# Altium footprint library SDRdrum.PcbLib: 35 footprints (part 1 of 3)
Each footprint in its own frame and in the unit in brackets; x right, y up, seen from the top. Pads: shape width x height; smd on the part's side, far side on the other; paste and mask are expansions set on the pad; w line width, h text height; cw(c..) or ccw(c..) is an arc to the next point about the centre after c.
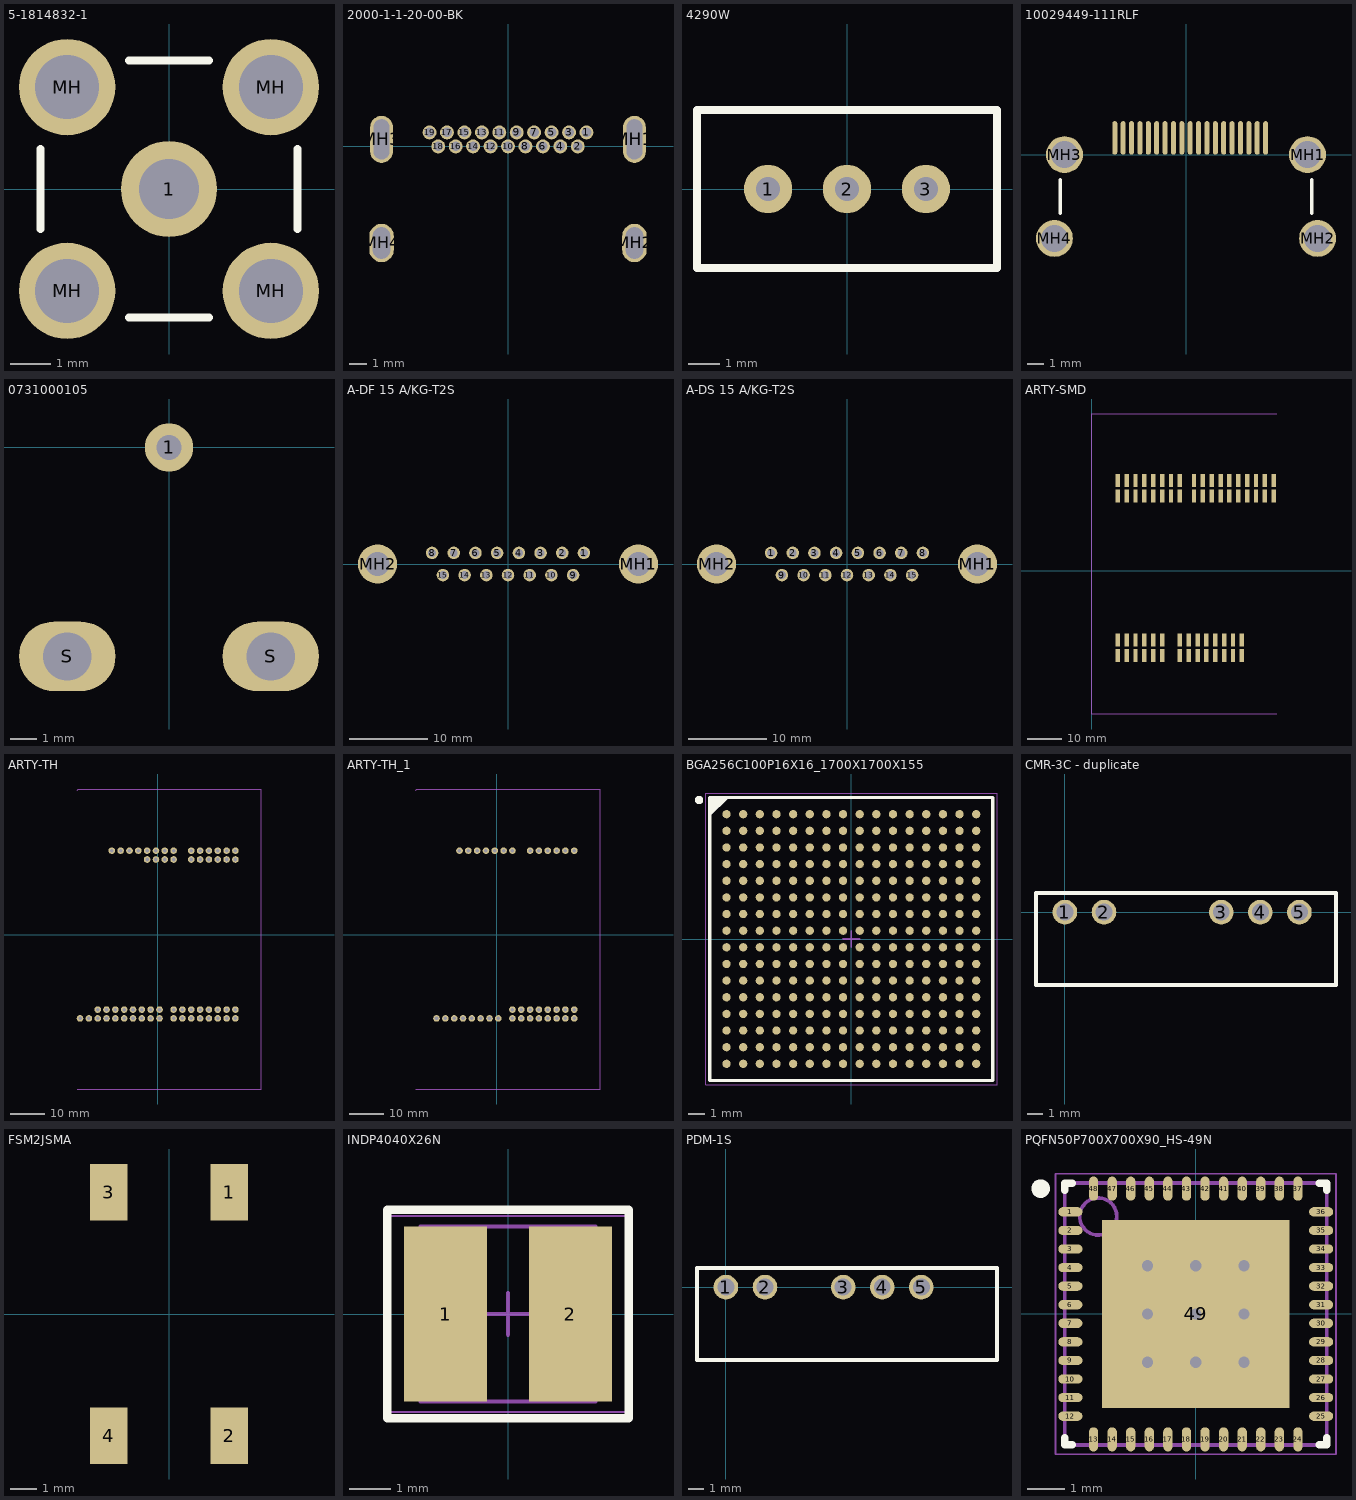
[diagram p0: the footprints below, top view; thin cyan lines are the x and y axes]

## 5-1814832-1 [mm]
pads (5):
  round 2.4 hole 1.5: 1(0,0)
  round 2.4 hole 1.6: MH(-2.54,-2.54) MH(-2.54,2.54) MH(2.54,-2.54) MH(2.54,2.54)
Top Overlay:
  lines w0.2: -3.2,-1 -3.2,1 ; -1,-3.2 1,-3.2 ; -1,3.2 1,3.2 ; 3.2,-1 3.2,1
3D body "c-5-1814832-1-b-3d.stp": height 9.5, standoff -4, extent -3.2,-3.2 3.2,3.2

## 2000-1-1-20-00-BK [mm]
height 5.55
pads (23):
  round 0.8 hole 0.55: 1(4.5,0.8) 2(4,0) 3(3.5,0.8) 4(3,0) 5(2.5,0.8) 6(2,0) 7(1.5,0.8) 8(1,0) 9(0.5,0.8) 10(0,0) 11(-0.5,0.8) 12(-1,0) 13(-1.5,0.8) 14(-2,0) 15(-2.5,0.8) 16(-3,0) 17(-3.5,0.8) 18(-4,0) 19(-4.5,0.8)
  oval 1.3x2.7 hole 2.3 slot 0.9 at 0 deg: MH1(7.25,0.4) MH3(-7.25,0.4)
  oval 1.4x2.2 hole 1.8 slot 1 at 0 deg: MH2(7.25,-5.54) MH4(-7.25,-5.54)

## 4290W [mil]
pads (3):
  round 60 hole 30: 1(-98.43,0) 2(0,0) 3(98.43,0)
Top Overlay:
  lines w10: -187.01,-98.43 -187.01,98.43 187.01,98.43 187.01,-98.43 -187.01,-98.43
3D body: height 393.7, standoff 0, extent -187.01,-98.43 187.01,98.43

## 10029449-111RLF [mm]
height 6.1
pads (23):
  oval 0.3x2 smd: 1(4.75,1) 2(4.25,1) 3(3.75,1) 4(3.25,1) 5(2.75,1) 6(2.25,1) 7(1.75,1) 8(1.25,1) 9(0.75,1) 10(0.25,1) 11(-0.25,1) 12(-0.75,1) 13(-1.25,1) 14(-1.75,1) 15(-2.25,1) 16(-2.75,1) 17(-3.25,1) 18(-3.75,1) 19(-4.25,1)
  round 2.2 hole 1.6: MH1(7.25,0) MH2(7.85,-5) MH3(-7.25,0) MH4(-7.85,-5)
Top Overlay:
  lines w0.2: -7.5,-3.5 -7.5,-1.5 ; 7.5,-3.5 7.5,-1.5
3D body "10029449-111RLF.stp": height 6.28, standoff -1.86, extent -8.1,-8.45 8.1,1.65

## 0731000105 [mm]
height 8.6
pads (3):
  round 1.8 hole 0.92: 1(0,0)
  oval 3.6x2.6 hole 1.8: S(-3.8,-7.8) S(3.8,-7.8)
3D body: height 8.6, standoff 0, extent -4.822,-12.4 4.822,-3.6
3D body: height 8.62, standoff -1.02, extent -4.822,-25.4 4.822,-12.4

## A-DF 15 A/KG-T2S [mm]
height 12.55
pads (17):
  round 1.6 hole 1: 1(9.695,1.42) 2(6.925,1.42) 3(4.155,1.42) 4(1.385,1.42) 5(-1.385,1.42) 6(-4.155,1.42) 7(-6.925,1.42) 8(-9.695,1.42) 9(8.31,-1.42) 10(5.54,-1.42) 11(2.77,-1.42) 12(0,-1.42) 13(-2.77,-1.42) 14(-5.54,-1.42) 15(-8.31,-1.42)
  round 5 hole 3.05: MH1(16.65,0) MH2(-16.65,0)
3D body "connector_a-df_15_a_kg-t2.stp": height 12.77, standoff -4.1, extent -19.57,-15.3 19.57,3

## A-DS 15 A/KG-T2S [mm]
height 12.55
pads (17):
  round 1.6 hole 1: 1(-9.695,1.42) 2(-6.925,1.42) 3(-4.155,1.42) 4(-1.385,1.42) 5(1.385,1.42) 6(4.155,1.42) 7(6.925,1.42) 8(9.695,1.42) 9(-8.31,-1.42) 10(-5.54,-1.42) 11(-2.77,-1.42) 12(0,-1.42) 13(2.77,-1.42) 14(5.54,-1.42) 15(8.31,-1.42)
  round 5 hole 3.05: MH1(16.65,0) MH2(-16.65,0)
3D body "connector_a-ds_15_a_kg-t2.stp": height 12.77, standoff -4.1, extent -19.57,-15.6 19.57,3

## ARTY-SMD [mm]
pads (64):
  rect 1.27x3.68 smd: 1(43.008,-24.205) 2(40.468,-24.205) 3(37.928,-24.205) 4(35.388,-24.205) 5(32.848,-24.205) 6(30.308,-24.205) 7(27.768,-24.205) 8(25.228,-24.205) 9(20.148,-24.205) 10(17.608,-24.205) 11(15.068,-24.205) 12(12.528,-24.205) 13(9.988,-24.205) 14(7.448,-24.205) 15(32.848,-19.765) 16(30.308,-19.765) 17(27.768,-19.765) 18(25.228,-19.765) 19(20.148,-19.765) 20(17.608,-19.765) 21(15.068,-19.765) 22(12.528,-19.765) 23(9.988,-19.765) 24(7.448,-19.765) 25(47.072,21.515) 26(44.532,21.515) 27(41.992,21.515) 28(39.452,21.515) 29(36.912,21.515) 30(34.372,21.515) 31(31.832,21.515) 32(29.292,21.515) 33(25.228,21.515) 34(22.688,21.515) 35(20.148,21.515) 36(17.608,21.515) 37(15.068,21.515) 38(12.528,21.515) 39(9.988,21.515) 40(7.448,21.515) 41(52.152,25.955) 42(49.612,25.955) 43(47.072,25.955) 44(44.532,25.955) 45(41.992,25.955) 46(39.452,25.955) 47(36.912,25.955) 48(34.372,25.955) 49(31.832,25.955) 50(29.292,25.955) 51(25.228,25.955) 52(22.688,25.955) 53(20.148,25.955) 54(17.608,25.955) 55(15.068,25.955) 56(12.528,25.955) 57(9.988,25.955) 58(7.448,25.955) NC(35.388,-19.765) NC(37.928,-19.765) NC(40.468,-19.765) NC(43.008,-19.765) NC(49.612,21.515) NC(52.152,21.515)
Mechanical 1:
  lines w0.2: 53,-41 0,-41 0,45 53,45
3D body "015912200.stp": height 9.74, standoff 0.09, extent 28.022,20.243 53.422,27.228
3D body "015912120.stp": height 9.74, standoff 0.09, extent 6.178,-25.477 21.418,-18.492
3D body "015912160.stp": height 9.74, standoff 0.09, extent 6.178,20.243 26.498,27.228
3D body "015912160.stp": height 9.74, standoff 0.09, extent 23.958,-25.477 44.278,-18.492
3D body "Arty Rev C.stp": height 17.7, standoff -2.3, extent 0.1,-41.06 111.315,45.3

## ARTY-TH [mil]
pads (58):
  round 75 hole 40: 1(-520,950) 2(-420,950) 3(-320,950) 4(-220,950) 5(-120,950) 6(-20,950) 7(80,950) 8(180,950) 9(380,950) 10(480,950) 11(580,950) 12(680,950) 13(780,950) 14(880,950) 15(-120,850) 16(-20,850) 17(80,850) 18(180,850) 19(380,850) 20(480,850) 21(580,850) 22(680,850) 23(780,850) 24(880,850) 25(-680,-850) 26(-580,-850) 27(-480,-850) 28(-380,-850) 29(-280,-850) 30(-180,-850) 31(-80,-850) 32(20,-850) 33(180,-850) 34(280,-850) 35(380,-850) 36(480,-850) 37(580,-850) 38(680,-850) 39(780,-850) 40(880,-850) 41(-880,-950) 42(-780,-950) 43(-680,-950) 44(-580,-950) 45(-480,-950) 46(-380,-950) 47(-280,-950) 48(-180,-950) 49(-80,-950) 50(20,-950) 51(180,-950) 52(280,-950) 53(380,-950) 54(480,-950) 55(580,-950) 56(680,-950) 57(780,-950) 58(880,-950)
Mechanical 13:
  lines w7.87: -913.7,-1749.21 1172.91,-1749.21 1172.91,1648.43 -901.89,1648.43 -913.7,1636.61
3D body "Arty Rev C.stp": height 657.6, standoff -129.92, extent -3209.57,-1749.22 1168.97,1650.78

## ARTY-TH_1 [mil]
pads (37):
  round 75 hole 40: 2(-420,950) 3(-320,950) 4(-220,950) 5(-120,950) 6(-20,950) 7(80,950) 8(180,950) 9(380,950) 10(480,950) 11(580,950) 12(680,950) 13(780,950) 14(880,950) 33(180,-850) 34(280,-850) 35(380,-850) 36(480,-850) 37(580,-850) 38(680,-850) 39(780,-850) 40(880,-850) 43(-680,-950) 44(-580,-950) 45(-480,-950) 46(-380,-950) 47(-280,-950) 48(-180,-950) 49(-80,-950) 50(20,-950) 51(180,-950) 52(280,-950) 53(380,-950) 54(480,-950) 55(580,-950) 56(680,-950) 57(780,-950) 58(880,-950)
Mechanical 13:
  lines w7.87: -913.7,-1749.21 1172.91,-1749.21 1172.91,1648.43 -901.89,1648.43 -913.7,1636.61
3D body "Arty Rev C.stp": height 696.97, standoff -90.55, extent -3209.57,-1749.22 1168.98,1650.78

## BGA256C100P16X16_1700X1700X155 [mm] "BGA, 256-Leads, Body 17.00x17.00mmx1.55mm, Pitch 1.00mm"
height 1.55
pads (256):
  round 0.5 smd: A1(-7.5,7.5) A2(-6.5,7.5) A3(-5.5,7.5) A4(-4.5,7.5) A5(-3.5,7.5) A6(-2.5,7.5) A7(-1.5,7.5) A8(-0.5,7.5) A9(0.5,7.5) A10(1.5,7.5) A11(2.5,7.5) A12(3.5,7.5) A13(4.5,7.5) A14(5.5,7.5) A15(6.5,7.5) A16(7.5,7.5) B1(-7.5,6.5) B2(-6.5,6.5) B3(-5.5,6.5) B4(-4.5,6.5) B5(-3.5,6.5) B6(-2.5,6.5) B7(-1.5,6.5) B8(-0.5,6.5) B9(0.5,6.5) B10(1.5,6.5) B11(2.5,6.5) B12(3.5,6.5) B13(4.5,6.5) B14(5.5,6.5) B15(6.5,6.5) B16(7.5,6.5) C1(-7.5,5.5) C2(-6.5,5.5) C3(-5.5,5.5) C4(-4.5,5.5) C5(-3.5,5.5) C6(-2.5,5.5) C7(-1.5,5.5) C8(-0.5,5.5) C9(0.5,5.5) C10(1.5,5.5) C11(2.5,5.5) C12(3.5,5.5) C13(4.5,5.5) C14(5.5,5.5) C15(6.5,5.5) C16(7.5,5.5) D1(-7.5,4.5) D2(-6.5,4.5) D3(-5.5,4.5) D4(-4.5,4.5) D5(-3.5,4.5) D6(-2.5,4.5) D7(-1.5,4.5) D8(-0.5,4.5) D9(0.5,4.5) D10(1.5,4.5) D11(2.5,4.5) D12(3.5,4.5) D13(4.5,4.5) D14(5.5,4.5) D15(6.5,4.5) D16(7.5,4.5) E1(-7.5,3.5) E2(-6.5,3.5) E3(-5.5,3.5) E4(-4.5,3.5) E5(-3.5,3.5) E6(-2.5,3.5) E7(-1.5,3.5) E8(-0.5,3.5) E9(0.5,3.5) E10(1.5,3.5) E11(2.5,3.5) E12(3.5,3.5) E13(4.5,3.5) E14(5.5,3.5) E15(6.5,3.5) E16(7.5,3.5) F1(-7.5,2.5) F2(-6.5,2.5) F3(-5.5,2.5) F4(-4.5,2.5) F5(-3.5,2.5) F6(-2.5,2.5) F7(-1.5,2.5) F8(-0.5,2.5) F9(0.5,2.5) F10(1.5,2.5) F11(2.5,2.5) F12(3.5,2.5) F13(4.5,2.5) F14(5.5,2.5) F15(6.5,2.5) F16(7.5,2.5) G1(-7.5,1.5) G2(-6.5,1.5) G3(-5.5,1.5) G4(-4.5,1.5) G5(-3.5,1.5) G6(-2.5,1.5) G7(-1.5,1.5) G8(-0.5,1.5) G9(0.5,1.5) G10(1.5,1.5) G11(2.5,1.5) G12(3.5,1.5) G13(4.5,1.5) G14(5.5,1.5) G15(6.5,1.5) G16(7.5,1.5) H1(-7.5,0.5) H2(-6.5,0.5) H3(-5.5,0.5) H4(-4.5,0.5) H5(-3.5,0.5) H6(-2.5,0.5) H7(-1.5,0.5) H8(-0.5,0.5) H9(0.5,0.5) H10(1.5,0.5) H11(2.5,0.5) H12(3.5,0.5) H13(4.5,0.5) H14(5.5,0.5) H15(6.5,0.5) H16(7.5,0.5) J1(-7.5,-0.5) J2(-6.5,-0.5) J3(-5.5,-0.5) J4(-4.5,-0.5) J5(-3.5,-0.5) J6(-2.5,-0.5) J7(-1.5,-0.5) J8(-0.5,-0.5) J9(0.5,-0.5) J10(1.5,-0.5) J11(2.5,-0.5) J12(3.5,-0.5) J13(4.5,-0.5) J14(5.5,-0.5) J15(6.5,-0.5) J16(7.5,-0.5) K1(-7.5,-1.5) K2(-6.5,-1.5) K3(-5.5,-1.5) K4(-4.5,-1.5) K5(-3.5,-1.5) K6(-2.5,-1.5) K7(-1.5,-1.5) K8(-0.5,-1.5) K9(0.5,-1.5) K10(1.5,-1.5) K11(2.5,-1.5) K12(3.5,-1.5) K13(4.5,-1.5) K14(5.5,-1.5) K15(6.5,-1.5) K16(7.5,-1.5) L1(-7.5,-2.5) L2(-6.5,-2.5) L3(-5.5,-2.5) L4(-4.5,-2.5) L5(-3.5,-2.5) L6(-2.5,-2.5) L7(-1.5,-2.5) L8(-0.5,-2.5) L9(0.5,-2.5) L10(1.5,-2.5) L11(2.5,-2.5) L12(3.5,-2.5) L13(4.5,-2.5) L14(5.5,-2.5) L15(6.5,-2.5) L16(7.5,-2.5) M1(-7.5,-3.5) M2(-6.5,-3.5) M3(-5.5,-3.5) M4(-4.5,-3.5) M5(-3.5,-3.5) M6(-2.5,-3.5) M7(-1.5,-3.5) M8(-0.5,-3.5) M9(0.5,-3.5) M10(1.5,-3.5) M11(2.5,-3.5) M12(3.5,-3.5) M13(4.5,-3.5) M14(5.5,-3.5) M15(6.5,-3.5) M16(7.5,-3.5) N1(-7.5,-4.5) N2(-6.5,-4.5) N3(-5.5,-4.5) N4(-4.5,-4.5) N5(-3.5,-4.5) N6(-2.5,-4.5) N7(-1.5,-4.5) N8(-0.5,-4.5) N9(0.5,-4.5) N10(1.5,-4.5) N11(2.5,-4.5) N12(3.5,-4.5) N13(4.5,-4.5) N14(5.5,-4.5) N15(6.5,-4.5) N16(7.5,-4.5) P1(-7.5,-5.5) P2(-6.5,-5.5) P3(-5.5,-5.5) P4(-4.5,-5.5) P5(-3.5,-5.5) P6(-2.5,-5.5) P7(-1.5,-5.5) P8(-0.5,-5.5) P9(0.5,-5.5) P10(1.5,-5.5) P11(2.5,-5.5) P12(3.5,-5.5) P13(4.5,-5.5) P14(5.5,-5.5) P15(6.5,-5.5) P16(7.5,-5.5) R1(-7.5,-6.5) R2(-6.5,-6.5) R3(-5.5,-6.5) R4(-4.5,-6.5) R5(-3.5,-6.5) R6(-2.5,-6.5) R7(-1.5,-6.5) R8(-0.5,-6.5) R9(0.5,-6.5) R10(1.5,-6.5) R11(2.5,-6.5) R12(3.5,-6.5) R13(4.5,-6.5) R14(5.5,-6.5) R15(6.5,-6.5) R16(7.5,-6.5) T1(-7.5,-7.5) T2(-6.5,-7.5) T3(-5.5,-7.5) T4(-4.5,-7.5) T5(-3.5,-7.5) T6(-2.5,-7.5) T7(-1.5,-7.5) T8(-0.5,-7.5) T9(0.5,-7.5) T10(1.5,-7.5) T11(2.5,-7.5) T12(3.5,-7.5) T13(4.5,-7.5) T14(5.5,-7.5) T15(6.5,-7.5) T16(7.5,-7.5)
Top Overlay:
  circle w0.25: c-9.15,8.35 r0.125
  region: -7.5,8.5 -8.5,7.5 -8.5,8.5
  lines w0.2: -8.5,7.5 -7.5,8.5 ; -8.5,-8.5 -8.5,8.5 8.5,8.5 8.5,-8.5 -8.5,-8.5
Mechanical 13:
  lines w0.1: -8.5,-8.5 -8.5,8.5 8.5,8.5 8.5,-8.5 -8.5,-8.5
Mechanical 15:
  lines w0.05: -8.75,-8.75 -8.75,8.75 8.75,8.75 8.75,-8.75 -8.75,-8.75
  lines w0.1: -0.5,0 0.5,0 ; 0,-0.5 0,0.5
3D body "BGA256C100P16X16_1700X1700X155.step": height 1.55, standoff 0, extent -8.5,-8.5 8.5,8.5

## CMR-3C - duplicate [mm]
pads (5):
  round 1.6 hole 1.1: 1(0,0) 2(2.54,0) 3(10.16,0) 4(12.7,0) 5(15.24,0)
Top Overlay:
  lines w0.254: -1.88,-4.75 17.62,-4.75 17.62,1.25 -1.88,1.25 -1.88,-4.75
3D body: height 10, standoff 0, extent -2,-4.75 17.62,1.25

## FSM2JSMA [mm]
height 4.29
pads (4):
  rect 1.4x2.1 smd: 1(2.25,4.55) 2(2.25,-4.55) 3(-2.25,4.55) 4(-2.25,-4.55)
3D body "c-2-1437565-8-s-3d.stp": height 4.43, standoff 0.04, extent -3,-5 3,5

## INDP4040X26N [mm] "Precision Wire Wound Inductor, 2-Leads, Body 4.00x4.00mm, IPC Medium Density"
height 2.6
pads (2):
  rect 2x4.2 smd: 1(-1.5,0) 2(1.5,0)
Top Overlay:
  lines w0.2: -2.9,-2.5 -2.9,2.5 2.9,2.5 2.9,-2.5 -2.9,-2.5
Mechanical 13:
  lines w0.1: -2.1,-2.1 2.1,-2.1 2.1,2.1 -2.1,2.1 -2.1,-2.1
Mechanical 15:
  lines w0.05: -2.925,-2.35 2.925,-2.35 2.925,2.35 -2.925,2.35 -2.925,-2.35
  lines w0.1: -0.5,0 0.5,0 ; 0,-0.5 0,0.5
3D body "INDP4040X26N.step": height 2.7, standoff 0, extent -2.1,-2 2.1,2

## PDM-1S [mm]
pads (5):
  round 1.6 hole 1.1: 1(0,0) 2(2.54,0) 3(7.62,0) 4(10.16,0) 5(12.7,0)
Top Overlay:
  lines w0.254: -1.88,-4.75 17.62,-4.75 17.62,1.25 -1.88,1.25 -1.88,-4.75
3D body: height 10, standoff 0, extent -2,-4.75 17.62,1.25

## PQFN50P700X700X90_HS-49N [mm] "PQFN, 48-Leads, Body 7.00x7.00mm, Pitch 0.50mm, Thermal Pad 5.05x5.05mm, IPC Medium Density"
height 0.9
pads (49):
  oval 0.65x0.25 smd: 1(-3.375,2.75) 2(-3.375,2.25) 3(-3.375,1.75) 4(-3.375,1.25) 5(-3.375,0.75) 6(-3.375,0.25) 7(-3.375,-0.25) 8(-3.375,-0.75) 9(-3.375,-1.25) 10(-3.375,-1.75) 11(-3.375,-2.25) 12(-3.375,-2.75) 25(3.375,-2.75) 26(3.375,-2.25) 27(3.375,-1.75) 28(3.375,-1.25) 29(3.375,-0.75) 30(3.375,-0.25) 31(3.375,0.25) 32(3.375,0.75) 33(3.375,1.25) 34(3.375,1.75) 35(3.375,2.25) 36(3.375,2.75)
  oval 0.25x0.65 smd: 13(-2.75,-3.375) 14(-2.25,-3.375) 15(-1.75,-3.375) 16(-1.25,-3.375) 17(-0.75,-3.375) 18(-0.25,-3.375) 19(0.25,-3.375) 20(0.75,-3.375) 21(1.25,-3.375) 22(1.75,-3.375) 23(2.25,-3.375) 24(2.75,-3.375) 37(2.75,3.375) 38(2.25,3.375) 39(1.75,3.375) 40(1.25,3.375) 41(0.75,3.375) 42(0.25,3.375) 43(-0.25,3.375) 44(-0.75,3.375) 45(-1.25,3.375) 46(-1.75,3.375) 47(-2.25,3.375) 48(-2.75,3.375)
  rect 5.05x5.05 smd: 49(0,0)
via -1.3,1.3 diameter 0.6 hole 0.3
via 0,1.3 diameter 0.6 hole 0.3
via 1.3,1.3 diameter 0.6 hole 0.3
via -1.3,0 diameter 0.6 hole 0.3
via 0,0 diameter 0.6 hole 0.3
via 1.3,0 diameter 0.6 hole 0.3
via -1.3,-1.3 diameter 0.6 hole 0.3
via 0,-1.3 diameter 0.6 hole 0.3
via 1.3,-1.3 diameter 0.6 hole 0.3
Top Overlay:
  circle w0.25: c-4.175,3.375 r0.125
  lines w0.2: -3.525,-3.325 -3.525,-3.525 -3.325,-3.525 ; -3.525,3.325 -3.525,3.525 -3.325,3.525 ; 3.325,-3.525 3.525,-3.525 3.525,-3.325 ; 3.325,3.525 3.525,3.525 3.525,3.325
Assembly Top:
  circle w0.1: c-2.625,2.625 r0.5
  lines w0.1: -3.525,-3.525 -3.525,3.525 3.525,3.525 3.525,-3.525 -3.525,-3.525
Courtyard Top:
  lines w0.05: -3.775,-3.775 -3.775,3.775 3.775,3.775 3.775,-3.775 -3.775,-3.775
  lines w0.1: -0.5,0 0.5,0 ; 0,-0.5 0,0.5
3D body "PQFN50P700X700X90_HS-49N.step": height 0.9, standoff 0, extent -3.525,-3.525 3.525,3.525